# Altium footprint library EXPLORER.PcbLib: 252 footprints (part 1 of 16)
Each footprint in its own frame and in the unit in brackets; x right, y up, seen from the top. Pads: shape width x height; smd on the part's side, far side on the other; paste and mask are expansions set on the pad; w line width, h text height; cw(c..) or ccw(c..) is an arc to the next point about the centre after c.
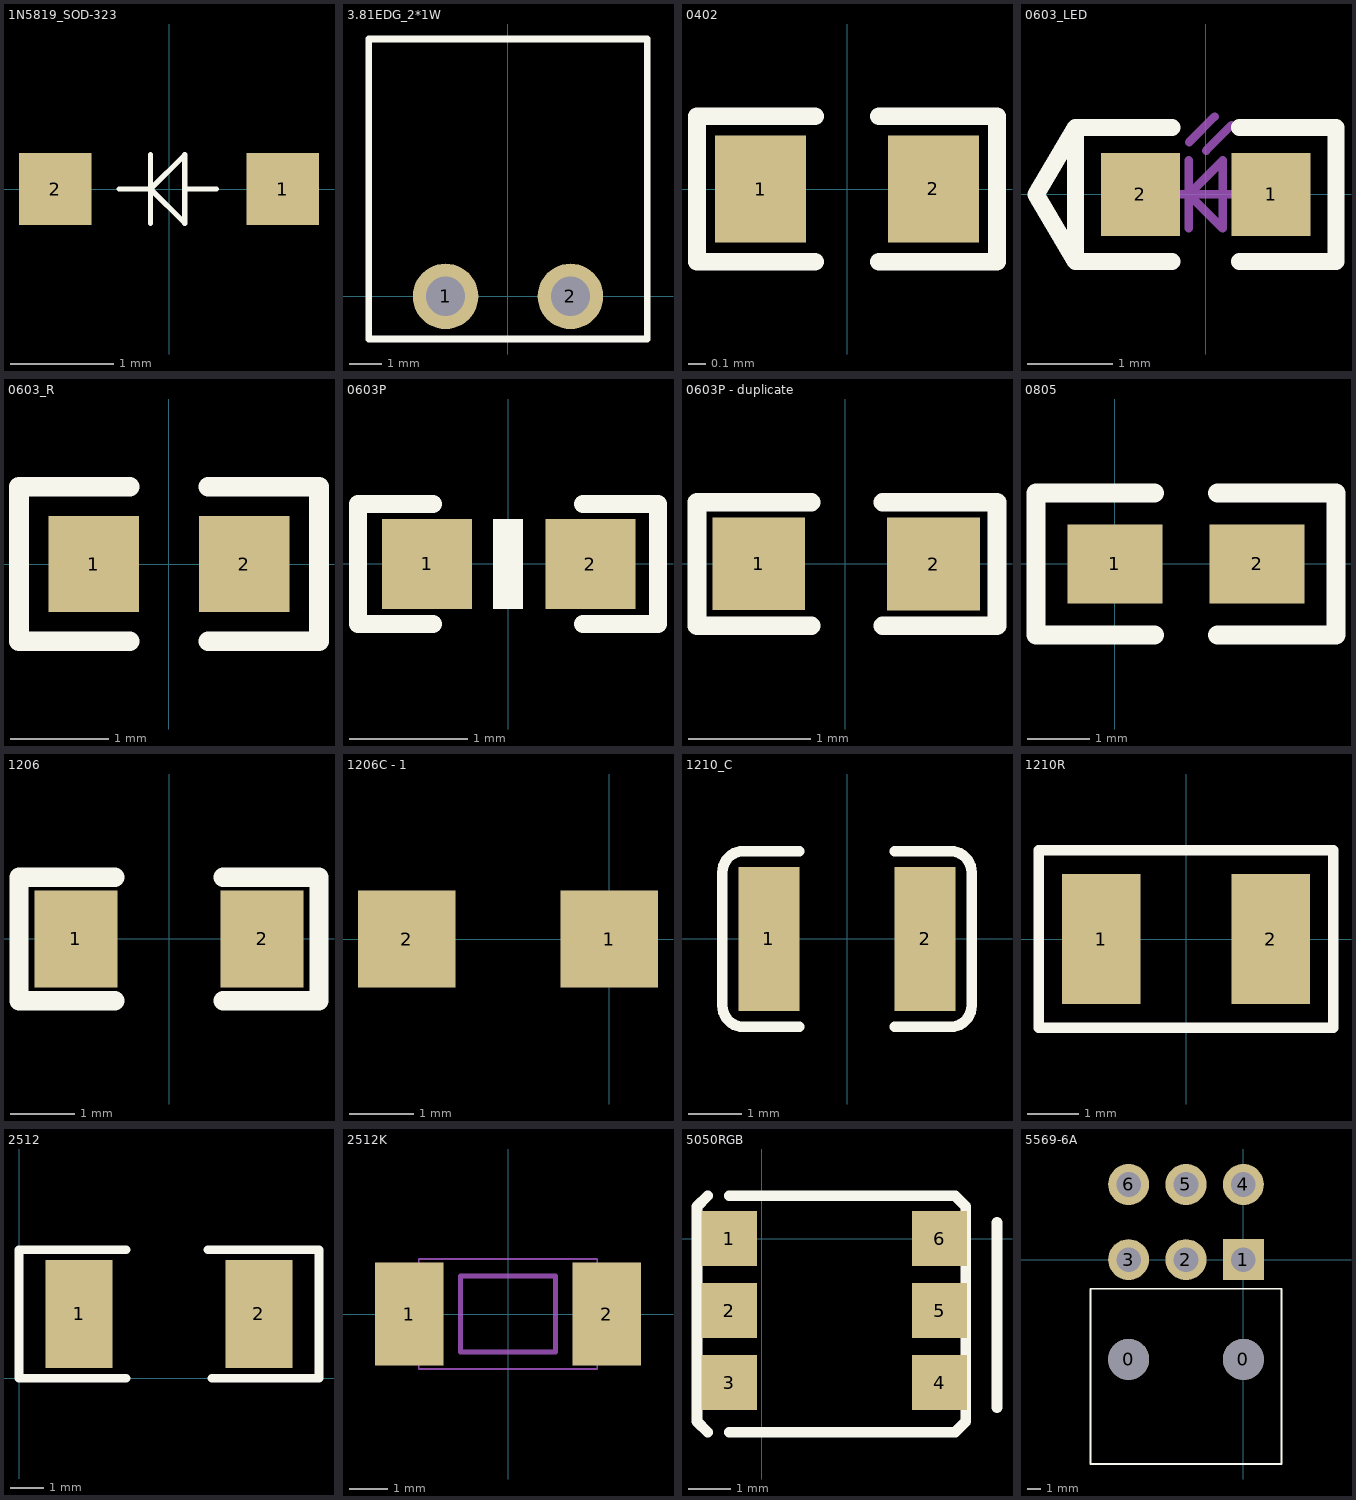
[diagram p0: the footprints below, top view; thin cyan lines are the x and y axes]

## 1N5819_SOD-323 [mm] "0805封装"
height 1.2
pads (2):
  rect 0.7x0.7 smd: 1(1.1,0) 2(-1.1,0)
Top Overlay:
  lines w0.051: -0.483,0 -0.178,0 ; -0.178,-0.33 -0.178,0.33 -0.178,0 ; 0.152,0 0.457,0 ; -0.178,0 0.152,-0.33 0.152,0.33 -0.178,0

## 3.81EDG_2*1W [mm]
pads (2):
  round 2 hole 1.2: 1(-1.905,0) 2(1.905,0)
Top Overlay:
  lines w0.2: -4.25,-1.3 -4.25,7.85 -2.9,7.85 3.578,7.85 4.25,7.85 4.25,-1.3 3.578,-1.3 -4.25,-1.3

## 0402 [mil]
pads (2):
  rect 20x23.62 smd: 1(-19,0) 2(19,0)
Top Overlay:
  lines w3.94: -7,-16 -33,-16 -33,16 -7,16 ; 7,-16 33,-16 33,16 7,16

## 0603_LED [mm]
pads (2):
  rect 0.93x0.98 smd: 1(0.77,0) 2(-0.77,0)
Top Overlay:
  lines w0.2: -0.4,-0.79 -1.535,-0.79 ; -0.4,0.79 -1.535,0.79 ; 0.4,-0.79 1.535,-0.79 1.535,0.79 0.4,0.79 ; -1.535,-0.79 -1.535,0.79 ; -1.535,-0.79 -2,0 -1.535,0.79
Mechanical 13:
  lines w0.1: -0.4,0 0.4,0 ; -0.2,-0.4 -0.2,0.4 ; -0.195,0.617 0.105,0.917 ; 0.005,0.517 0.305,0.817 ; -0.2,0 0.2,-0.4 0.2,0.4 -0.2,0
3D body: height 0.6, standoff 0, extent -0.8,-0.4 0.8,0.4

## 0603_R [mm]
pads (2):
  rect 0.93x0.98 smd: 1(-0.77,0) 2(0.77,0)
Top Overlay:
  lines w0.2: -0.4,-0.79 -1.535,-0.79 -1.535,0.79 -0.4,0.79 ; 0.4,-0.79 1.535,-0.79 1.535,0.79 0.4,0.79
3D body: height 0.56, standoff 0, extent -0.85,-0.4 0.85,0.4

## 0603P [mil]
pads (2):
  rect 30x30 smd: 1(-27,0) 2(27.5,-0.06)
Top Overlay:
  region: 5,-15.06 5,14.94 -5,14.94 -5,-15.06
  lines w6: -25,-20.06 -50,-20.06 -50,19.94 -25,19.94 ; 25,-20.06 50,-20.06 50,19.94 25,19.94

## 0603P - duplicate [mil]
pads (2):
  rect 30x30 smd: 1(-28,0) 2(28.5,-0.06)
Top Overlay:
  lines w6: -11,-20.06 -48,-20.06 -48,19.94 -11,19.94 ; 12,-20.06 49,-20.06 49,19.94 12,19.94

## 0805 [mil]
pads (2):
  rect 60x50 smd: 1(0,-0.06) 2(90,-0.06)
Top Overlay:
  lines w12: 25,-45.06 -50,-45.06 -50,44.94 25,44.94 ; 65,-45.06 140,-45.06 140,44.94 65,44.94

## 1206 [mil]
pads (2):
  rect 51.18x60 smd: 1(-57.5,0) 2(57.5,0)
Top Overlay:
  lines w12: -33.46,-38 -92.52,-38 -92.52,38 -33.46,38 ; 33.46,-38 92.52,-38 92.52,38 33.46,38

## 1206C - 1 [mil]
pads (2):
  rect 60x60 smd: 1(0,0) 2(-125,0)

## 1210_C [mm]
pads (2):
  rect 1.16x2.72 smd: 1(-1.475,0) 2(1.475,0)
Top Overlay:
  lines w0.2: -0.9,-1.66 -1.955,-1.66 cw(c-1.955,-1.26) -2.355,-1.26 -2.355,1.26 cw(c-1.955,1.26) -1.955,1.66 -0.9,1.66 ; 0.9,-1.66 1.955,-1.66 ccw(c1.955,-1.26) 2.355,-1.26 2.355,1.26 ccw(c1.955,1.26) 1.955,1.66 0.9,1.66

## 1210R [mil]
pads (2):
  rect 60x100 smd: 1(-65,0) 2(65,0)
Top Overlay:
  lines w8: -113,-68 -113,68 40,68 113,68 113,-68 40,-68 -113,-68
3D body: height 23.62, standoff 0, extent -62.99,-50.21 62.99,48.21

## 2512 [mm]
pads (2):
  rect 2x3.2 smd: 1(1.778,1.905) 2(7.112,1.905)
Top Overlay:
  lines w0.254: 3.175,0 0,0 0,3.81 3.175,3.81 ; 5.588,3.81 8.89,3.81 8.89,0 5.715,0

## 2512K [mm] "2mOhm"
pads (2):
  rect 1.8x2.7 smd: 1(-2.6,0) 2(2.6,0)
Mechanical 4:
  lines w0.127: -1.25,-1 1.25,-1 ; -1.25,-1 -1.25,1 ; -1.25,-1 1.25,-1 ; -1.25,-1 -1.25,1 ; -1.25,1 1.25,1 ; -1.25,1 1.25,1 ; 1.25,-1 1.25,1 ; 1.25,-1 1.25,1
Mechanical 16:
  lines w0.05: -2.35,-1.45 2.35,-1.45 2.35,1.45 -2.35,1.45 -2.35,-1.45
3D body: height 1.06, standoff 0, extent -3.175,-1.55 3.175,1.5

## 5050RGB [mm]
pads (6):
  rect 1.3x1.3 smd: 1(-0.762,0) 2(-0.762,-1.7) 3(-0.762,-3.4) 4(4.208,-3.4) 5(4.208,-1.7) 6(4.208,0)
Top Overlay:
  lines w0.25: -1.27,-4.572 -1.524,-4.318 -1.524,0.762 -1.27,1.016 ; -0.762,-4.572 4.572,-4.572 4.826,-4.318 4.826,0.762 4.572,1.016 -0.762,1.016
  lines w0.254: 5.563,-3.988 5.563,0.381

## 5569-6A [mm]
height 1.4
pads (8):
  round 3 hole 3: 0(-8.4,-7.3) 0(0,-7.3)
  rect 3x3 hole 1.8: 1(0,0)
  round 3 hole 1.8: 2(-4.2,0) 3(-8.4,0) 4(0,5.5) 5(-4.2,5.5) 6(-8.4,5.5)
Top Overlay:
  lines w0.127: -11.2,-14.965 -11.2,-2.125 2.8,-2.125 2.8,-14.965 -11.2,-14.965